# Altium footprint library Sajad_Altium_Library.PcbLib: 380 footprints (part 4 of 24)
Each footprint in its own frame and in the unit in brackets; x right, y up, seen from the top. Pads: shape width x height; smd on the part's side, far side on the other; paste and mask are expansions set on the pad; w line width, h text height; cw(c..) or ccw(c..) is an arc to the next point about the centre after c.
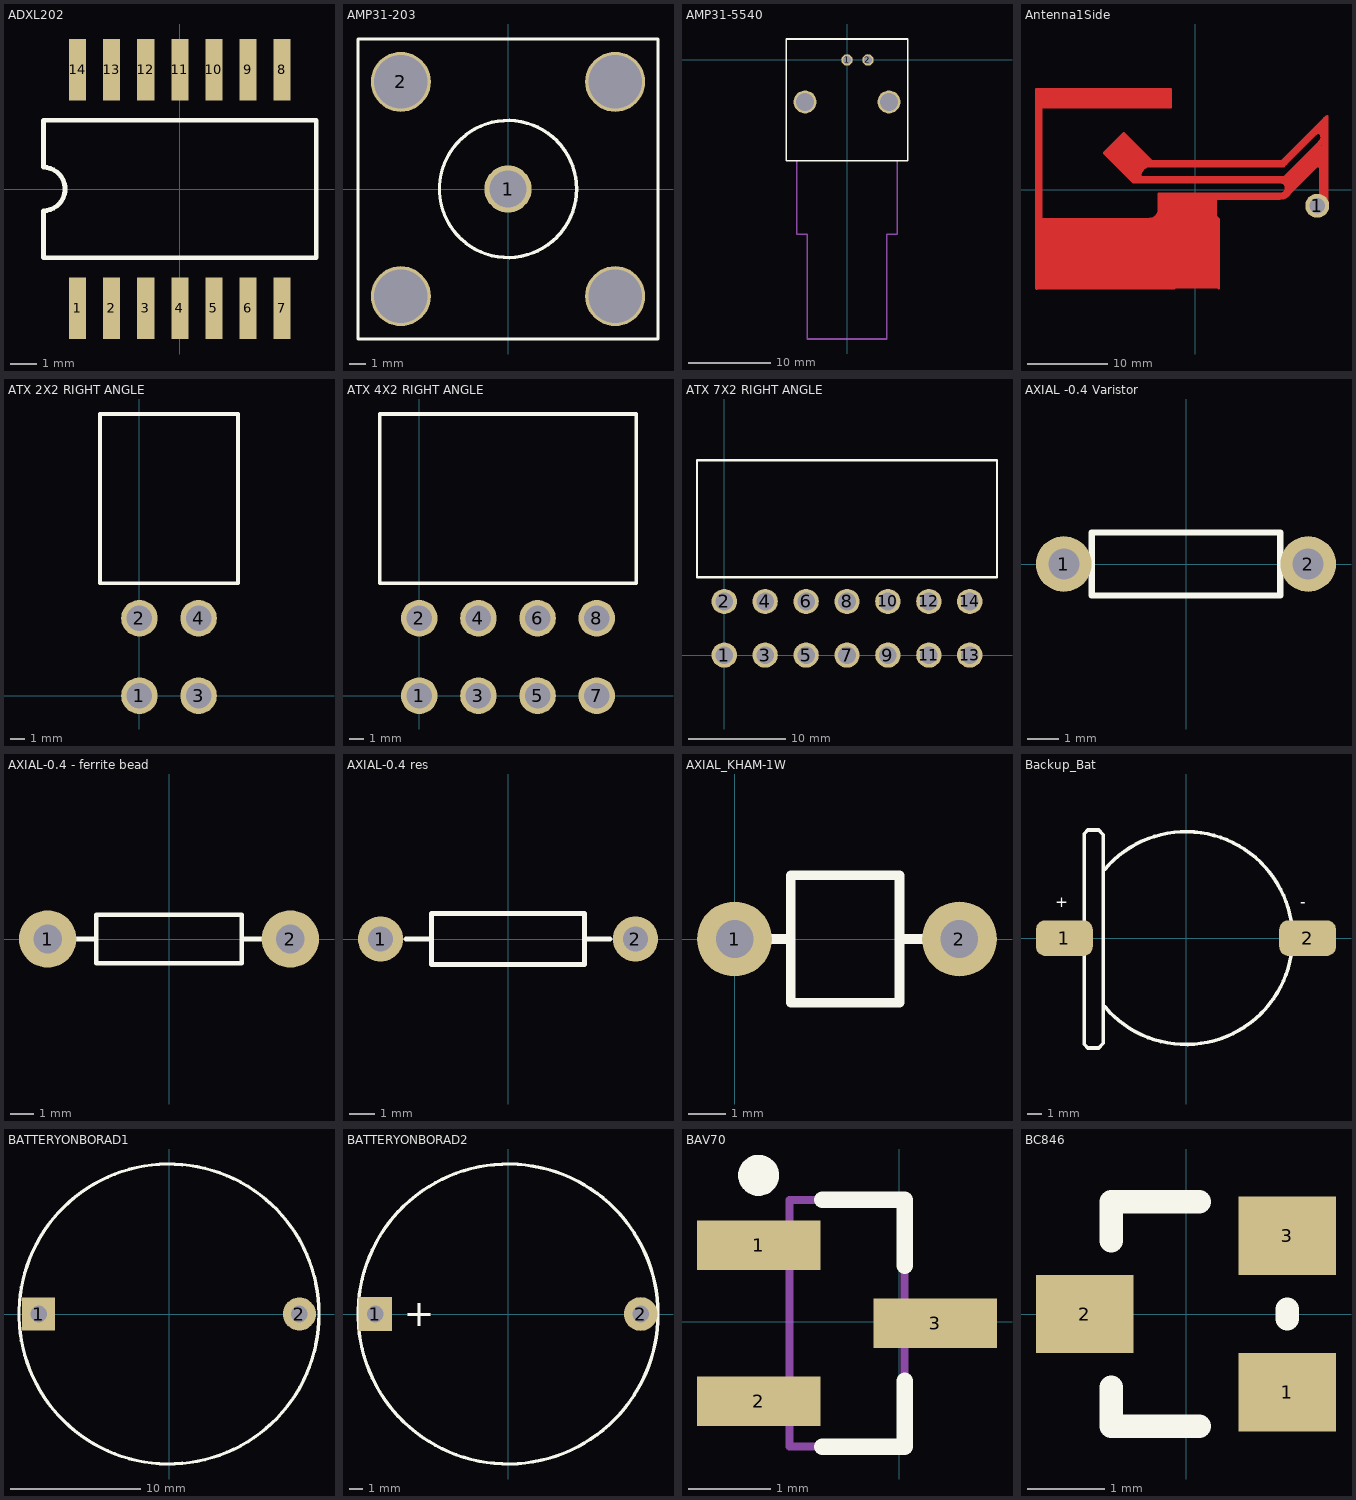
[diagram p3: the footprints below, top view; thin cyan lines are the x and y axes]

## ADXL202 [mil] "Accelerometers with Digital Output"
pads (14):
  rect 25x90 smd: 1(-150,-175) 2(-100,-175) 3(-50,-175) 4(0,-175) 5(50,-175) 6(100,-175) 7(150,-175) 8(150,175) 9(100,175) 10(50,175) 11(0,175) 12(-50,175) 13(-100,175) 14(-150,175)
Top Overlay:
  lines w7: -200,-101 -200,-31.78 ccw(c-200,0) -200,31.78 -200,101 200,101 200,0 200,-101 -200,-101

## AMP31-203 [mil]
pads (5):
  round 110 hole 86: 1(0,0)
  round 140 hole 125: 2(-250,250) ""(-250,-250) ""(250,-250) ""(250,250)
Top Overlay:
  circle w8: c0,0 r160
  lines w8: -350,-350 350,-350 350,350 -350,350 -350,-350

## AMP31-5540 [mil]
pads (4):
  round 55 hole 38: 1(0,0) 2(100,0)
  round 110 hole 86: ""(-200,-200) ""(200,-200)
Top Overlay:
  lines w8: -290,-480 -290,100 290,100 290,-480 -290,-480
Mechanical 1:
  lines w8: -240,-480 -240,-830 -190,-830 -190,-1330 190,-1330 190,-830 240,-830 240,-480

## Antenna1Side [mm]
height 0.55
pads (1):
  round 3 hole 2: 1(15.24,-2.032)
Top Layer:
  region: -3.048,12.573 -19.939,12.573 -19.939,10.414 -3.048,10.414
  region: -19.304,10.795 -19.939,10.795 -19.939,-12.383 -19.304,-12.383
  region: -2.667,-3.81 -19.685,-3.81 -19.685,-12.382 -2.667,-12.383
  region: 2.413,-0.508 -1.27,-0.508 -1.27,-4.699 2.413,-4.699
  region: -4.191,-3.683 -5.461,-3.683 -5.461,-3.937 -4.191,-3.937
  region: 2.794,-3.556 2.413,-3.556 2.413,-3.937 2.794,-3.937
  region: 2.413,-3.302 2.286,-3.302 2.286,-3.937 2.413,-3.937
  region: 2.667,-3.302 2.286,-3.302 2.286,-3.937 2.667,-3.937
  region: -6.604,4.699 -10.16,4.699 -10.16,3.302 -6.604,3.302
  region: -5.633,3.601 -8.954,6.921 -11.303,4.572 -7.983,1.252
  region: 11.049,3.556 -6.096,3.556 -6.096,2.921 11.049,2.921
  region: 11.049,1.524 -7.493,1.524 -7.493,0.889 11.049,0.889
  region: 10.795,-0.508 -4.064,-0.508 -4.064,-1.143 10.795,-1.143
  region: 12.129,-0.064 16.474,4.282 15.141,5.616 10.795,1.27
  region: 10.985,2.857 16.637,8.509 16.192,8.954 10.541,3.302
  region: 16.51,4.445 15.621,4.445 15.621,-1.651 16.51,-1.651
  region: 16.256,7.62 15.621,7.62 15.621,7.112 16.256,7.112
  region: -1.143,-0.508 -4.445,-0.508 -4.445,-5.08 -1.143,-5.08
  region: 2.921,-3.81 -3.81,-3.81 -3.81,-12.383 2.921,-12.383
  lines w0.3: -19.939,-4.699 -19.939,12.573 -3.048,12.573 -3.048,10.287 -19.304,10.287 -19.304,-3.683 -17.018,-3.683 -7.874,-3.683 ; -19.939,-3.81 -19.939,-12.319 -19.812,-12.446 ; -19.875,-12.383 -2.667,-12.383 ; -9.017,6.985 -11.43,4.572 -7.747,0.889 ; -8.954,7.048 -5.461,3.556 ; -8.636,-3.683 -5.461,-3.683 ; -8.001,1.651 -6.096,3.556 -5.461,3.556 ; -7.983,1.252 -7.938,1.206 -7.747,1.206 ; -7.493,0.889 -7.493,1.905 ; -7.493,1.524 -7.493,1.905 ; -7.493,1.714 -7.302,1.905 ; -7.112,1.905 -7.302,1.905 ; -6.604,2.667 -6.731,2.667 -7.112,2.286 ; -6.477,2.921 -6.096,2.921 -6.223,3.048 -6.223,3.175 -5.969,3.175 ; -5.842,-3.683 ccw(c-5.779,-2.476) -4.572,-2.54 -4.572,-0.508 10.795,-0.508 ccw(c10.668,0.127) 11.303,0.254 ; -5.207,-3.683 -4.953,-3.683 ; -4.445,-2.794 -4.445,-3.175 ; -3.048,-1.143 10.541,-1.143 ; -1.397,-2.54 -1.397,-0.508 ; 2.667,-1.143 2.54,-1.27 2.54,-3.302 2.921,-3.683 2.921,-6.35 2.921,-12.383 ; 9.906,-0.889 ccw(c10.668,0.191) 11.748,-0.572 15.24,2.921 cw(c15.303,2.603) 15.621,2.667 ; 10.668,-0.762 11.303,-0.762 ; 10.922,-0.889 11.049,-0.762 11.049,-0.508 11.938,0.381 ; 10.986,-0.826 10.986,-0.699 ; 11.049,0.889 11.303,0.635 11.557,0.635 ; 11.049,3.175 11.176,3.175 ; 11.43,0.762 11.557,0.635 ; 11.43,1.016 11.811,0.635 11.811,0.254 ; 11.557,0.381 11.557,0.635 ; 12.002,-0.063 11.303,-0.762 ; 15.113,3.175 15.875,3.175 ; 15.141,5.616 16.256,4.501 16.256,4.445 16.256,8.255 16.256,8.001 15.494,7.239 15.367,7.239 ; 15.621,-1.651 15.621,1.143 15.621,2.667 ; 15.621,3.683 15.621,2.667 ; 15.621,7.112 16.002,7.112 ; 15.811,7.112 16.002,6.921 16.002,6.731 ; 15.875,6.096 15.875,5.842 ; 16.002,5.588 16.002,7.112 ; 16.138,8.899 10.795,3.556 -4.699,3.556 -5.461,3.556 ; 16.161,8.876 cw(c16.573,8.7) 16.51,9.144 ; 16.236,8.783 16.47,9.017 16.51,9.017 ; 16.256,4.826 15.494,5.588 15.494,5.715 15.748,5.715 15.875,5.842 ; 16.256,7.62 16.256,5.08 16.256,5.207 ; 16.51,-1.894 16.51,1.489 16.51,8.89 ; -7.747,0.889 10.668,0.889 cw(c10.668,0.254) 11.303,0.254 ; -7.747,0.889 -7.747,1.524 -7.62,1.397 -7.493,1.397 -7.302,1.587 -7.302,1.905 ; -7.493,1.905 -7.112,2.286 ; -7.493,1.905 -7.112,2.286 ; -7.112,2.286 -6.996,2.286 -6.985,2.275 -6.985,1.524 -7.112,1.651 -7.112,2.286 ; -4.953,-3.683 -4.445,-3.175 ; -4.953,-3.683 -4.572,-3.683 -4.445,-3.556 -4.445,-3.175 ; 11.303,-0.762 11.303,-0.508 11.684,-0.127 11.938,0.127 11.938,0.381 ; 11.303,0.254 11.811,0.254 ; 11.811,0.254 11.938,0.381 ; 15.494,5.969 ccw(c15.05,6.54) 15.621,6.985 ccw(c15.367,6.731) 15.113,6.985 11.367,3.238 11.049,2.921 -5.842,2.921 ccw(c-5.651,1.714) -6.81,2.101 ccw(c-6.482,1.852) -6.731,1.524 11.049,1.524 15.494,5.969 ; 15.494,5.969 16.256,5.207 ; 15.494,5.969 15.621,5.842 15.875,5.842 ; 16.002,7.112 16.002,7.239 15.748,7.493 16.256,7.493 16.256,5.207 ; 16.51,8.89 16.51,9.017 ; 16.51,8.89 16.51,9.144 ; 16.51,9.017 16.51,9.144

## ATX 2X2 RIGHT ANGLE [mm]
pads (4):
  round 2.6 hole 1.8: 1(0,0) 2(0,5.5) 3(4.2,0) 4(4.2,5.5)
Top Overlay:
  lines w0.254: -2.8,7.986 7,7.986 ; -2.8,8 -2.8,20 7,20 7,8

## ATX 4X2 RIGHT ANGLE [mm]
pads (8):
  round 2.6 hole 1.8: 1(0,0) 2(0,5.5) 3(4.2,0) 4(4.2,5.5) 5(8.4,0) 6(8.4,5.5) 7(12.6,0) 8(12.6,5.5)
Top Overlay:
  lines w0.254: -2.8,7.986 15.4,7.986 ; -2.8,8 -2.8,20 15.4,20 15.4,8
3D body: height 11.3, standoff -3.5, extent -3.26,-0.508 15.24,19.627

## ATX 7X2 RIGHT ANGLE [mm]
pads (14):
  round 2.6 hole 1.8: 1(0,0) 2(0,5.5) 3(4.2,0) 4(4.2,5.5) 5(8.4,0) 6(8.4,5.5) 7(12.6,0) 8(12.6,5.5) 9(16.8,0) 10(16.8,5.5) 11(21,0) 12(21,5.5) 13(25.2,0) 14(25.2,5.5)
Top Overlay:
  lines w0.254: -2.8,7.986 28,7.986 28,20 -2.8,20 -2.8,8

## AXIAL -0.4 Varistor [mm] "Axial Device, Thru-Hole; 2 Leads; 0.4 in Pin Spacing"
height 2.032
pads (2):
  round 1.8 hole 1: 1(-3.95,0) 2(3.95,0)
Top Overlay:
  lines w0.2: -3.048,-1.016 3.048,-1.016 3.048,1.016 -3.048,1.016 -3.048,-1.016

## AXIAL-0.4 - ferrite bead [mm] "Axial Device, Thru-Hole; 2 Leads; 0.4 in Pin Spacing"
height 2.032
pads (2):
  round 2.4 hole 1.2: 1(-5.08,0) 2(5.08,0)
Top Overlay:
  lines w0.2: -4.064,0 -3.048,0 ; 3.048,0 4.064,0 ; -3.048,-1.016 -3.048,1.016 3.048,1.016 3.048,-1.016 -3.048,-1.016
3D body: height 2.75, standoff -3, extent -5.25,-1.25 5.25,1.25

## AXIAL-0.4 res [mm] "Axial Device, Thru-Hole; 2 Leads; 0.4 in Pin Spacing"
height 2.032
pads (2):
  round 1.8 hole 1: 1(-5.08,0) 2(5.08,0)
Top Overlay:
  lines w0.2: -4.064,0 -3.048,0 ; 3.048,0 4.064,0 ; -3.048,-1.016 -3.048,1.016 3.048,1.016 3.048,-1.016 -3.048,-1.016
3D body: height 2.43, standoff -3.04, extent -5.385,-1.156 5.385,1.156

## AXIAL_KHAM-1W [mm]
pads (2):
  round 2 hole 1: 1(0,0) 2(6,0)
Top Overlay:
  lines w0.254: 0,0 1.5,0 ; 4.4,0 6,0 ; 1.5,-1.7 1.5,1.7 4.4,1.7 4.4,-1.7 1.5,-1.7

## Backup_Bat [mm]
height 0.55
pads (2):
  rrect50% 4x2.5 smd: 1(-8.572,0) 2(8.572,0)
Top Overlay:
  lines w0.25: -7.175,-7.493 -7.175,-7.239 -7.175,7.366 -6.921,7.62 -6.159,7.62 -5.829,7.29 -5.829,6.363 -5.829,-7.417 -6.159,-7.747 -6.921,-7.747 -7.175,-7.493
  lines w0.254: -5.753,-4.811 ccw(c0,0) -5.753,4.812
  text "+" at -9.207,2.159 h0.8
  text "-" at 8.064,2.159 h0.8
3D body: height 6.03, standoff 1.28, extent -9.705,-7.459 9.095,7.29

## BATTERYONBORAD1 [mm]
pads (2):
  rect 2.54x2.54 hole 1.27: 1(-10,0)
  round 2.54 hole 1.27: 2(10,0)
Top Overlay:
  circle w0.254: c0,0 r11.5
3D body: height 8.71, standoff -3.97, extent -12.288,-11.39 16.352,11.39

## BATTERYONBORAD2 [mm]
pads (2):
  rect 2.54x2.54 hole 1.27: 1(-10,0)
  round 2.54 hole 1.27: 2(10,0)
Top Overlay:
  circle w0.254: c0,0 r11.3
  text "+" at -7.849,-0.94 h2.03
3D body: height 3.55, standoff -5.5, extent -14.5,-10 14.5,10

## BAV70 [mm]
height 0.55
pads (3):
  rect 1.5x0.6 smd: 1(-1.711,0.932) 2(-1.711,-0.968) 3(0.439,-0.018)
Top Overlay:
  circle w0.25: c-1.711,1.782 r0.125
  lines w0.2: -0.936,-1.518 0.064,-1.518 0.064,-0.718 ; -0.936,1.482 0.064,1.482 0.064,0.682
Mechanical 13:
  lines w0.1: -1.336,-1.518 -1.336,1.482 0.064,1.482 0.064,-1.518 -1.336,-1.518
3D body: height 1.1, standoff 0, extent -1.336,-1.518 0.064,1.482

## BC846 [mil]
pads (3):
  rect 50x40 smd: 1(51.75,-40) 2(-51.75,0) 3(51.75,40)
Top Overlay:
  lines w12: -38.25,-37.5 -38.25,-57.5 6.75,-57.5 ; -38.25,37.5 -38.25,57.5 6.75,57.5 ; 51.75,-2.5 51.75,2.5
3D body: height 39.37, standoff -3.94, extent -59.53,-59.06 64.01,59.05